# Altium footprint library MS-Electronic.PcbLib: 202 footprints (part 8 of 13)
Each footprint in its own frame and in the unit in brackets; x right, y up, seen from the top. Pads: shape width x height; smd on the part's side, far side on the other; paste and mask are expansions set on the pad; w line width, h text height; cw(c..) or ccw(c..) is an arc to the next point about the centre after c.
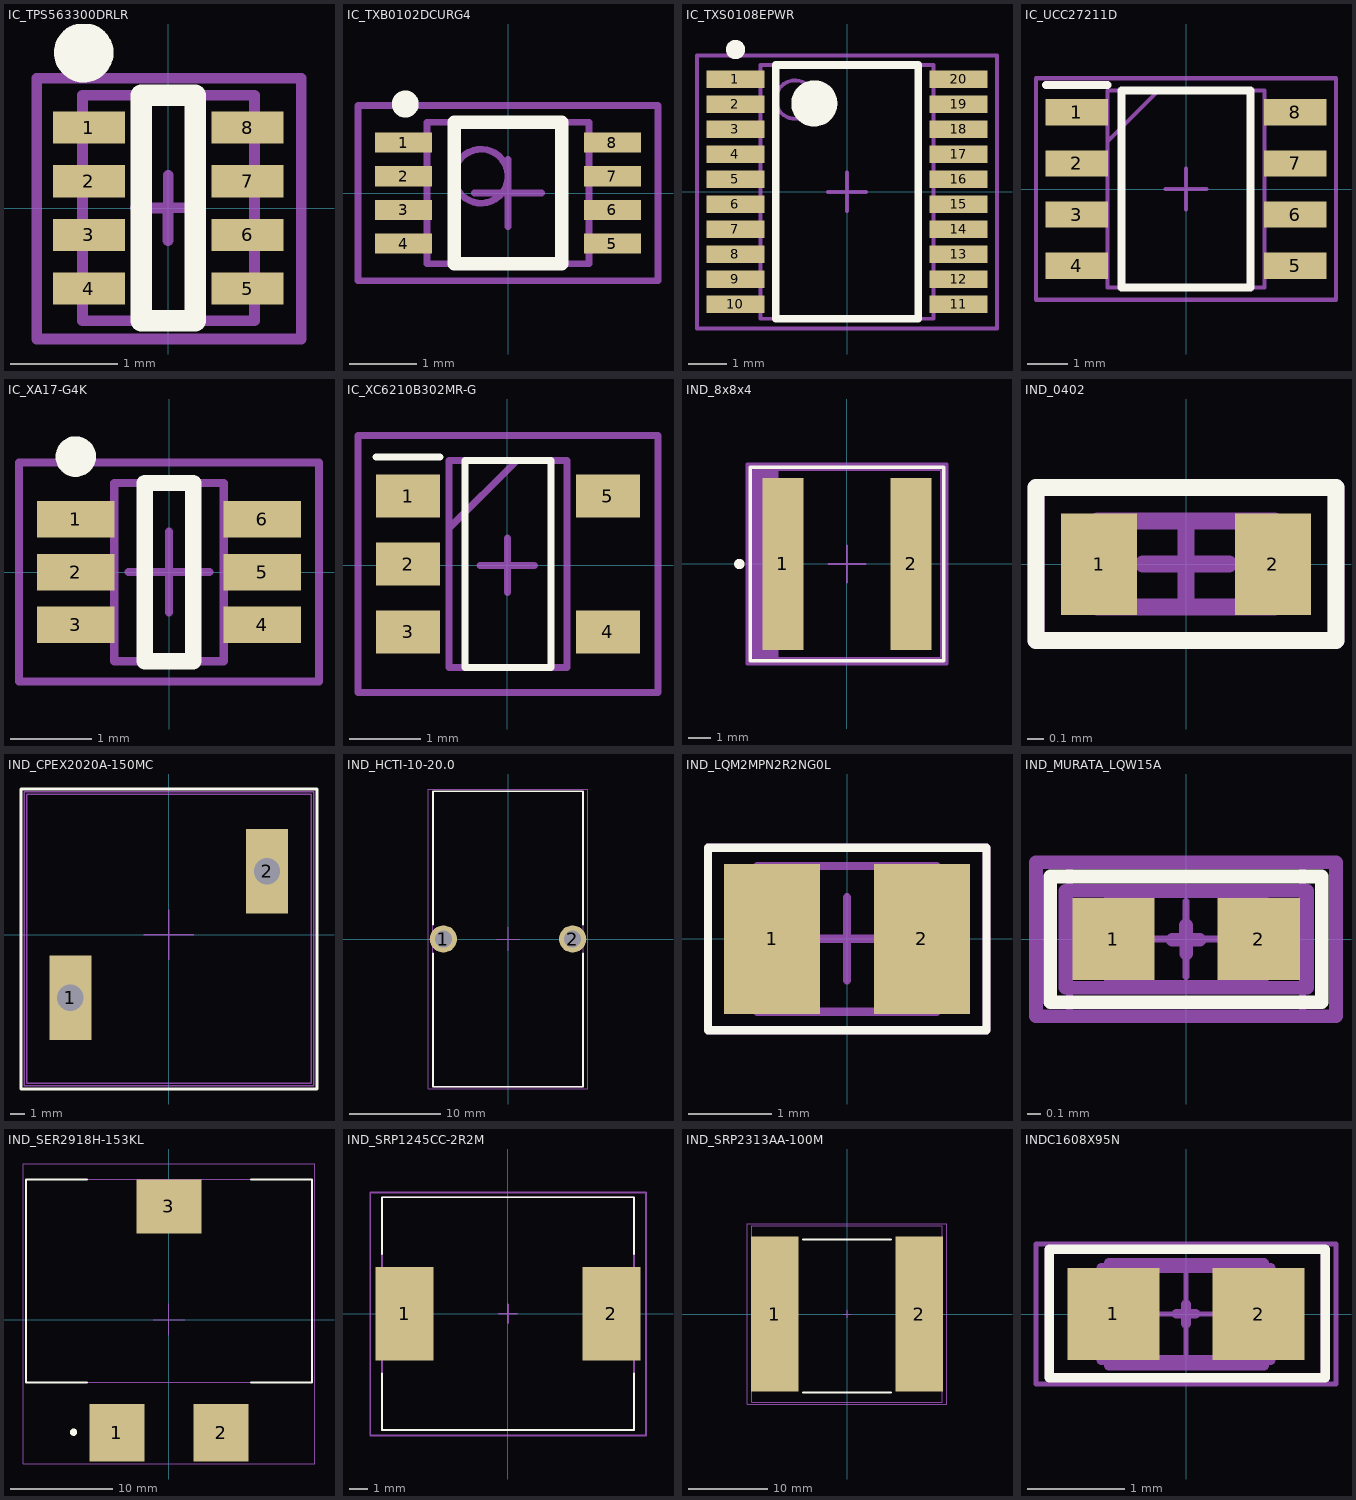
[diagram p7: the footprints below, top view; thin cyan lines are the x and y axes]

## IC_TPS563300DRLR [mm]
pads (8):
  rect 0.67x0.3 smd: 1(-0.74,0.75) 2(-0.74,0.25) 3(-0.74,-0.25) 4(-0.74,-0.75) 5(0.74,-0.75) 6(0.74,-0.25) 7(0.74,0.25) 8(0.74,0.75)
Top Overlay:
  circle w0.3: c-0.787,1.448 r0.127
  lines w0.2: -0.25,-1.05 -0.25,1.05 0.25,1.05 0.25,-1.05 -0.25,-1.05
Top Assembly:
  lines w0.1: -0.8,-1.05 0.802,-1.05 0.802,1.05 -0.8,1.05 -0.8,-1.05
  text "'.Designator'" at -1.687,-0.164 h0.76
Top Component Center (Mech15):
  lines w0.1: -0.305,0 0,0 0,0.305 ; -0.005,0.002 0.3,0.002 ; -0.003,-0.303 -0.003,0.002 ; -1.224,-1.22 1.238,-1.22 1.238,1.209 -1.224,1.209 -1.224,-1.22
3D body "TPS563300DRLR.stp": height 0.6, standoff 0, extent -0.8,-1.05 0.8,1.05

## IC_TXB0102DCURG4 [mm]
height 0.9
pads (8):
  rect 0.85x0.3 smd: 1(-1.55,0.75) 2(-1.55,0.25) 3(-1.55,-0.25) 4(-1.55,-0.75) 5(1.55,-0.75) 6(1.55,-0.25) 7(1.55,0.25) 8(1.55,0.75)
Top Overlay:
  circle w0.2: c-1.524,1.321 r0.1
  lines w0.2: -0.8,-1.05 -0.8,1.05 0.8,1.05 0.8,-1.05 -0.8,-1.05
Top Assembly:
  circle w0.1: c-0.4,0.25 r0.4
  lines w0.1: -1.2,-1.05 -1.2,1.05 1.2,1.05 1.2,-1.05 -1.2,-1.05
  text ".Designator" at -2.999,-0.2 h0.6
Top Component Center (Mech15):
  lines w0.1: -0.5,0 0.5,0 ; 0,-0.5 0,0.5 ; -2.225,-1.3 -2.225,1.3 2.225,1.3 2.225,-1.3 -2.225,-1.3
3D body "IC_TXB0102DCURG4.step": height 0.9, standoff 0, extent -1.549,-1.05 1.549,1.05

## IC_TXS0108EPWR [mm]
height 1.2
pads (20):
  rect 1.5x0.45 smd: 1(-2.9,2.925) 2(-2.9,2.275) 3(-2.9,1.625) 4(-2.9,0.975) 5(-2.9,0.325) 6(-2.9,-0.325) 7(-2.9,-0.975) 8(-2.9,-1.625) 9(-2.9,-2.275) 10(-2.9,-2.925) 11(2.9,-2.925) 12(2.9,-2.275) 13(2.9,-1.625) 14(2.9,-0.975) 15(2.9,-0.325) 16(2.9,0.325) 17(2.9,0.975) 18(2.9,1.625) 19(2.9,2.275) 20(2.9,2.925)
Top Overlay:
  circle w0.6: c-0.85,2.3 r0.3
  circle w0.25: c-2.9,3.7 r0.125
  lines w0.2: -1.85,-3.3 1.85,-3.3 1.85,3.3 -1.85,3.3 -1.85,-3.3
Top Assembly:
  circle w0.1: c-1.35,2.4 r0.5
  lines w0.1: -2.25,-3.3 2.25,-3.3 2.25,3.3 -2.25,3.3 -2.25,-3.3
  text ".Designator" at -3.999,-0.267 h0.8
Top Component Center (Mech15):
  lines w0.1: -0.5,0 0.5,0 ; 0,-0.5 0,0.5 ; -3.9,-3.55 3.9,-3.55 3.9,3.55 -3.9,3.55 -3.9,-3.55
3D body "IC_TXS0108EPWR.step": height 1.2, standoff 0, extent -3.2,-3.3 3.2,3.3

## IC_UCC27211D [mm]
pads (8):
  rect 1.55x0.65 smd mask+0.07: 1(-2.712,1.905) 2(-2.712,0.635) 3(-2.712,-0.635) 4(-2.712,-1.905) 5(2.712,-1.905) 6(2.712,-0.635) 7(2.712,0.635) 8(2.712,1.905)
Top Overlay:
  lines w0.2: -3.475,2.58 -1.95,2.58 ; -1.6,-2.45 1.6,-2.45 1.6,2.45 -1.6,2.45 -1.6,-2.45
Top Assembly:
  lines w0.1: -1.95,1.18 -0.68,2.45 ; -1.95,-2.45 1.95,-2.45 1.95,2.45 -1.95,2.45 -1.95,-2.45
  text ".Designator" at -2.499,-0.167 h0.5
Top Component Center (Mech15):
  lines w0.1: -0.508,0 0,0 ; 0,-0.508 0,0 ; 0,0.508 0,0 ; 0.508,0 0,0 ; -3.725,-2.75 3.725,-2.75 3.725,2.75 -3.725,2.75 -3.725,-2.75
3D body "NE555DR.stp": height 1.75, standoff 0, extent -3,-2.45 3,2.45

## IC_XA17-G4K [mm]
pads (6):
  rect 0.95x0.45 smd: 1(-1.15,0.65) 2(-1.15,0) 3(-1.15,-0.65) 4(1.15,-0.65) 5(1.15,0) 6(1.15,0.65)
Top Overlay:
  circle w0.25: c-1.15,1.425 r0.125
  lines w0.2: -0.3,-1.1 -0.3,1.1 0.3,1.1 0.3,-1.1 -0.3,-1.1
Top Assembly:
  lines w0.1: -0.675,-1.1 0.675,-1.1 0.675,1.1 -0.675,1.1 -0.675,-1.1
  text ".Designator" at -2.499,-0.167 h0.5
Top Component Center (Mech15):
  lines w0.1: -0.5,0 0.5,0 ; 0,-0.5 0,0.5 ; -1.85,-1.35 1.85,-1.35 1.85,1.35 -1.85,1.35 -1.85,-1.35
3D body "IC_XA17-G4K.step": height 1.1, standoff 0, extent -1.225,-1.1 1.225,1.1

## IC_XC6210B302MR-G [mm]
pads (5):
  rect 0.9x0.6 smd: 1(-1.391,0.969) 2(-1.391,0.019) 3(-1.391,-0.931) 4(1.409,-0.931) 5(1.409,0.969)
Top Overlay:
  lines w0.1: -1.841,1.519 -0.941,1.519 ; -0.591,-1.431 0.609,-1.431 0.609,1.469 -0.591,1.469 -0.591,-1.431
Top Assembly:
  lines w0.1: -0.816,0.519 0.134,1.469 ; -0.816,-1.431 0.834,-1.431 0.834,1.469 -0.816,1.469 -0.816,-1.431
  text ".Designator" at -2.499,-0.167 h0.5
Top Component Center (Mech15):
  lines w0.1: -0.381,0 0,0 ; 0,-0.381 0,0 ; 0,0.381 0,0 ; 0.381,0 0,0 ; -2.091,-1.781 2.109,-1.781 2.109,1.819 -2.091,1.819 -2.091,-1.781
3D body "XC6210B302MR-G.stp": height 1.2, standoff 0, extent -1.391,-1.431 1.409,1.469

## IND_8x8x4 [mil]
pads (2):
  rect 70.5x295 smd paste+0: 1(-110.25,0) 2(110.25,0)
Top Overlay:
  circle w11.81: c-185.04,0 r3
  lines w6: -166.5,-166.5 -166.5,166.5 166.5,166.5 166.5,-166.5 -166.5,-166.5
Top Assembly:
  rectangle: -161.41,-161.42 -117.99,161.42
  lines w3.94: -161.5,-161.5 -161.5,161.5 161.5,161.5 161.5,-161.5 -161.5,-161.5
  text ".Designator" at -118.07,-7.87 h23.62
Top 3D Body:
  circle w0: c-158.5,0 r3
  lines w1: -161.5,-161.5 -161.5,161.5 161.5,161.5 161.5,-161.5 -161.5,-161.5
Top Component Center (Mech15):
  lines w3.94: -31.5,0 0,0 ; 0,-31.5 0,0 ; 0,31.5 0,0 ; 31.5,0 0,0
  lines w6: -171.5,-171.5 171.5,-171.5 171.5,-157.5 171.5,157.5 171.5,171.5 -171.5,171.5 -171.5,157.5 -171.5,-157.5 -171.5,-171.5
3D body "IND_TAIYO_NRS8040_TAY.step": height 165, standoff 0, extent -161.5,-161.61 161.5,161.61

## IND_0402 [mm]
height 0.66
pads (2):
  rect 0.45x0.6 smd: 1(-0.515,0) 2(0.515,0)
Top Overlay:
  lines w0.1: -0.889,-0.452 0.889,-0.452 0.889,0.454 -0.889,0.454 -0.889,-0.452
Top Assembly:
  lines w0.1: -0.525,-0.255 0.525,-0.255 0.525,0.255 -0.525,0.255 -0.525,-0.255
  text ".Designator" at -1.5,-0.1 h0.3
Top Component Center (Mech15):
  lines w0.1: -0.255,0 0.255,0 ; 0,-0.255 0,0.255 ; -0.889,-0.452 0.889,-0.452 0.889,0.453 -0.889,0.453 -0.889,-0.452
3D body "IND_2.7nH_0402.step": height 0.66, standoff 0, extent -0.525,-0.255 0.525,0.255

## IND_CPEX2020A-150MC [mm]
pads (2):
  rect 3x6 hole 1.88 square: 1(-7,-4.5) 2(7,4.5)
Top Overlay:
  lines w0.2: -10.519,-10.99 10.563,-10.99 10.563,10.365 -10.519,10.365 -10.519,-10.99
Top Assembly:
  lines w0.1: -10.109,-10.566 10.135,-10.566 10.135,9.982 -10.109,9.982 -10.109,-10.566
  text ".Designator" at -4.998,-0.333 h1
Top Component Center (Mech15):
  lines w0.1: -1.778,0 0,0 ; 0,-1.778 0,0 ; 0,1.778 0,0 ; 1.778,0 0,0 ; -10.291,-10.77 10.328,-10.77 10.328,10.16 -10.291,10.16 -10.291,-10.77
3D body "CPEX2020A-150MC.stp": height 17.19, standoff -3.98, extent -10.123,-10.525 10.099,9.975

## IND_HCTI-10-20.0 [mm]
height 32.51
pads (2):
  round 3 hole 1.88: 1(-7.112,0) 2(7.112,0)
Top Overlay:
  lines w0.2: -8.255,-1.6 -8.255,-16.256 8.255,-16.256 8.255,-1.6 ; -8.255,1.6 -8.255,16.256 8.255,16.256 8.255,1.6
Top Assembly:
  lines w0.127: -8.255,-16.256 8.255,-16.256 8.255,16.256 -8.255,16.256 -8.255,-16.256
  text ".Designator" at -4.998,-0.333 h1
Top Component Center (Mech15):
  lines w0.1: -1.27,0 0,0 ; 0,-1.27 0,0 ; 0,1.27 0,0 ; 1.27,0 0,0 ; -8.78,-16.506 8.78,-16.506 8.78,16.506 -8.78,16.506 -8.78,-16.506
3D body "step_temp.STEP": height 34.1, standoff -10.16, extent -8.255,-16.211 8.255,16.211

## IND_LQM2MPN2R2NG0L [mm]
height 1
pads (2):
  rect 1.15x1.8 smd: 1(-0.9,0) 2(0.9,0)
Top Overlay:
  lines w0.1: -1.668,-1.097 -1.668,1.095 1.674,1.095 1.674,-1.097 -1.668,-1.097
Top Assembly:
  lines w0.1: -1.075,-0.875 -1.075,0.875 1.075,0.875 1.075,-0.875 -1.075,-0.875
  text ".Designator" at -2.499,-0.167 h0.5
Top Component Center (Mech15):
  lines w0.1: -0.5,0 0.5,0 ; 0,-0.5 0,0.5 ; -1.668,-1.097 -1.668,1.095 1.674,1.095 1.674,-1.097 -1.668,-1.097
3D body "IND_LQM2MPN2R2NG0L.step": height 1, standoff 0, extent -1.075,-0.875 1.075,0.875

## IND_MURATA_LQW15A [mm] "Inductor 2-Leads,Body 1.10x0.70x0.60mm(max)"
height 0.6
pads (2):
  rect 0.6x0.6 smd: 1(-0.53,0) 2(0.53,0)
Top Overlay:
  lines w0.1: -0.991,-0.461 -0.991,0.456 0.99,0.456 0.99,-0.461 -0.991,-0.461
Top Assembly:
  lines w0.1: -0.88,-0.355 -0.88,0.352 0.883,0.352 0.883,-0.355 -0.88,-0.355
  text ".Designator" at -1.999,-0.133 h0.4
Bottom 3D Body:
  lines w0.1: -0.55,-0.35 0.55,-0.35 0.55,0.35 -0.55,0.35 -0.55,-0.35
Top Component Center (Mech15):
  lines w0.1: -0.098,-0.005 0.002,-0.005 0.101,-0.005 ; 0,0 0,0.1 ; 0.002,-0.106 0.002,-0.006 ; -1.094,-0.563 -1.094,0.561 1.094,0.561 1.094,-0.563 -1.094,-0.563
Mechanical 17:
  lines w0.05: -0.275,0 0.275,0 ; 0,-0.275 0,0.275 ; -0.85,-0.575 -0.85,0.575 0.85,0.575 0.85,-0.575 -0.85,-0.575
3D body "IND_MURATA_LQW15AN.step": height 0.51, standoff 0, extent -0.5,-0.3 0.5,0.3

## IND_SER2918H-153KL [mm]
pads (3):
  rect 5.33x5.59 smd: 1(-5.075,-11.037) 2(5.075,-11.037)
  rect 6.35x5.28 smd: 3(0,11.038)
Top Overlay:
  circle w0.4: c-9.3,-10.982 r0.15
  circle w0.3: c-9.3,-10.982 r0.15
  lines w0.2: -7.99,-6.122 -13.95,-6.122 -13.95,13.678 -7.99,13.678 ; 7.99,-6.122 13.95,-6.122 13.95,13.678 7.99,13.678
Top Assembly:
  circle w0.3: c-9.3,-10.982 r0.15
  lines w0.1: -13.95,-6.122 -13.95,13.678 13.95,13.678 13.95,-6.122 -13.95,-6.122
  text ".Designator" at -4.998,-0.333 h1
Top Component Center (Mech15):
  lines w0.1: -1.524,0 0,0 ; 0,-1.524 0,0 ; 0,1.524 0,0 ; 1.524,0 0,0 ; -14.2,-14.082 -14.2,15.168 14.2,15.168 14.2,-14.082 7.99,-14.082 -7.99,-14.082 -14.2,-14.082
3D body "step_temp.STEP": height 17.98, standoff 0.2, extent -13.95,-13.483 13.95,14.458

## IND_SRP1245CC-2R2M [mm]
height 5
pads (2):
  rect 3.1x5 smd: 1(-5.55,0) 2(5.55,0)
Top Overlay:
  lines w0.1: -6.756,-3.2 -6.756,-6.248 6.756,-6.248 6.756,-3.2 ; -6.756,3.2 -6.756,6.248 6.756,6.248 6.756,3.2
Top Assembly:
  lines w0.1: -6.756,-6.248 -6.756,6.248 6.756,6.248 6.756,-6.248 -6.756,-6.248
  text ".Designator" at -2.499,-0.167 h0.5
Top Component Center (Mech15):
  lines w0.1: -0.5,0 0.5,0 ; 0,-0.5 0,0.5 ; -7.392,-6.538 -7.392,6.505 7.409,6.505 7.409,-6.538 -7.392,-6.538
3D body "SRP1245CC-2R2M.stp": height 5, standoff 0, extent -6.75,-6.25 6.75,6.25

## IND_SRP2313AA-100M [mm]
height 13
pads (2):
  rect 6x19.6 smd: 1(-9.125,0) 2(9.125,0)
Top Overlay:
  lines w0.2: -5.588,-9.906 5.588,-9.906 ; -5.588,9.398 5.588,9.398
Top Assembly:
  lines w0.1: -12,-11.15 12,-11.15 12,11.15 -12,11.15 -12,-11.15
  text ".Designator" at -4.998,-0.333 h1
Top Component Center (Mech15):
  lines w0.1: -0.5,0 0.5,0 ; 0,-0.5 0,0.5 ; -12.6,-11.4 12.6,-11.4 12.6,11.4 -12.6,11.4 -12.6,-11.4
3D body "SRP2313AA-100M.stp": height 13, standoff 0, extent -11.75,-11 11.75,11

## INDC1608X95N [mm] "Chip Inductor, 2-Leads, Body 1.75x0.95x0.95mm (0603)"
height 0.95
pads (2):
  rect 0.95x0.95 smd: 1(-0.75,0) 2(0.75,0)
Top Overlay:
  lines w0.1: -1.413,-0.659 1.437,-0.659 1.437,0.668 -1.413,0.668 -1.413,-0.659
Top Assembly:
  lines w0.1: -0.797,-0.534 -0.797,0.527 0.806,0.527 0.806,-0.534 -0.797,-0.534
  text ".Designator" at -2.499,-0.167 h0.5
Bottom 3D Body:
  lines w0.1: -0.875,-0.475 0.875,-0.475 0.875,0.475 -0.875,0.475 -0.875,-0.475
Top Component Center (Mech15):
  lines w0.1: -0.102,0.002 -0.002,0.002 0.098,0.002 ; 0,-0.1 0,0 0,0.1 ; -1.413,-0.659 1.437,-0.659 1.437,0.668 -1.413,0.668 -1.413,-0.659
Mechanical 17:
  lines w0.05: -0.475,0 0.475,0 ; 0,-0.475 0,0.475 ; -1.55,-0.725 1.55,-0.725 1.55,0.725 -1.55,0.725 -1.55,-0.725
3D body "Chip Inductor 0603.step": height 0.8, standoff 0, extent -0.8,-0.475 0.8,0.475